# Altium integrated library Integrated_Library1.IntLib: 59 symbols
Pins are listed as number, name and electrical type; pins without a type are passive.

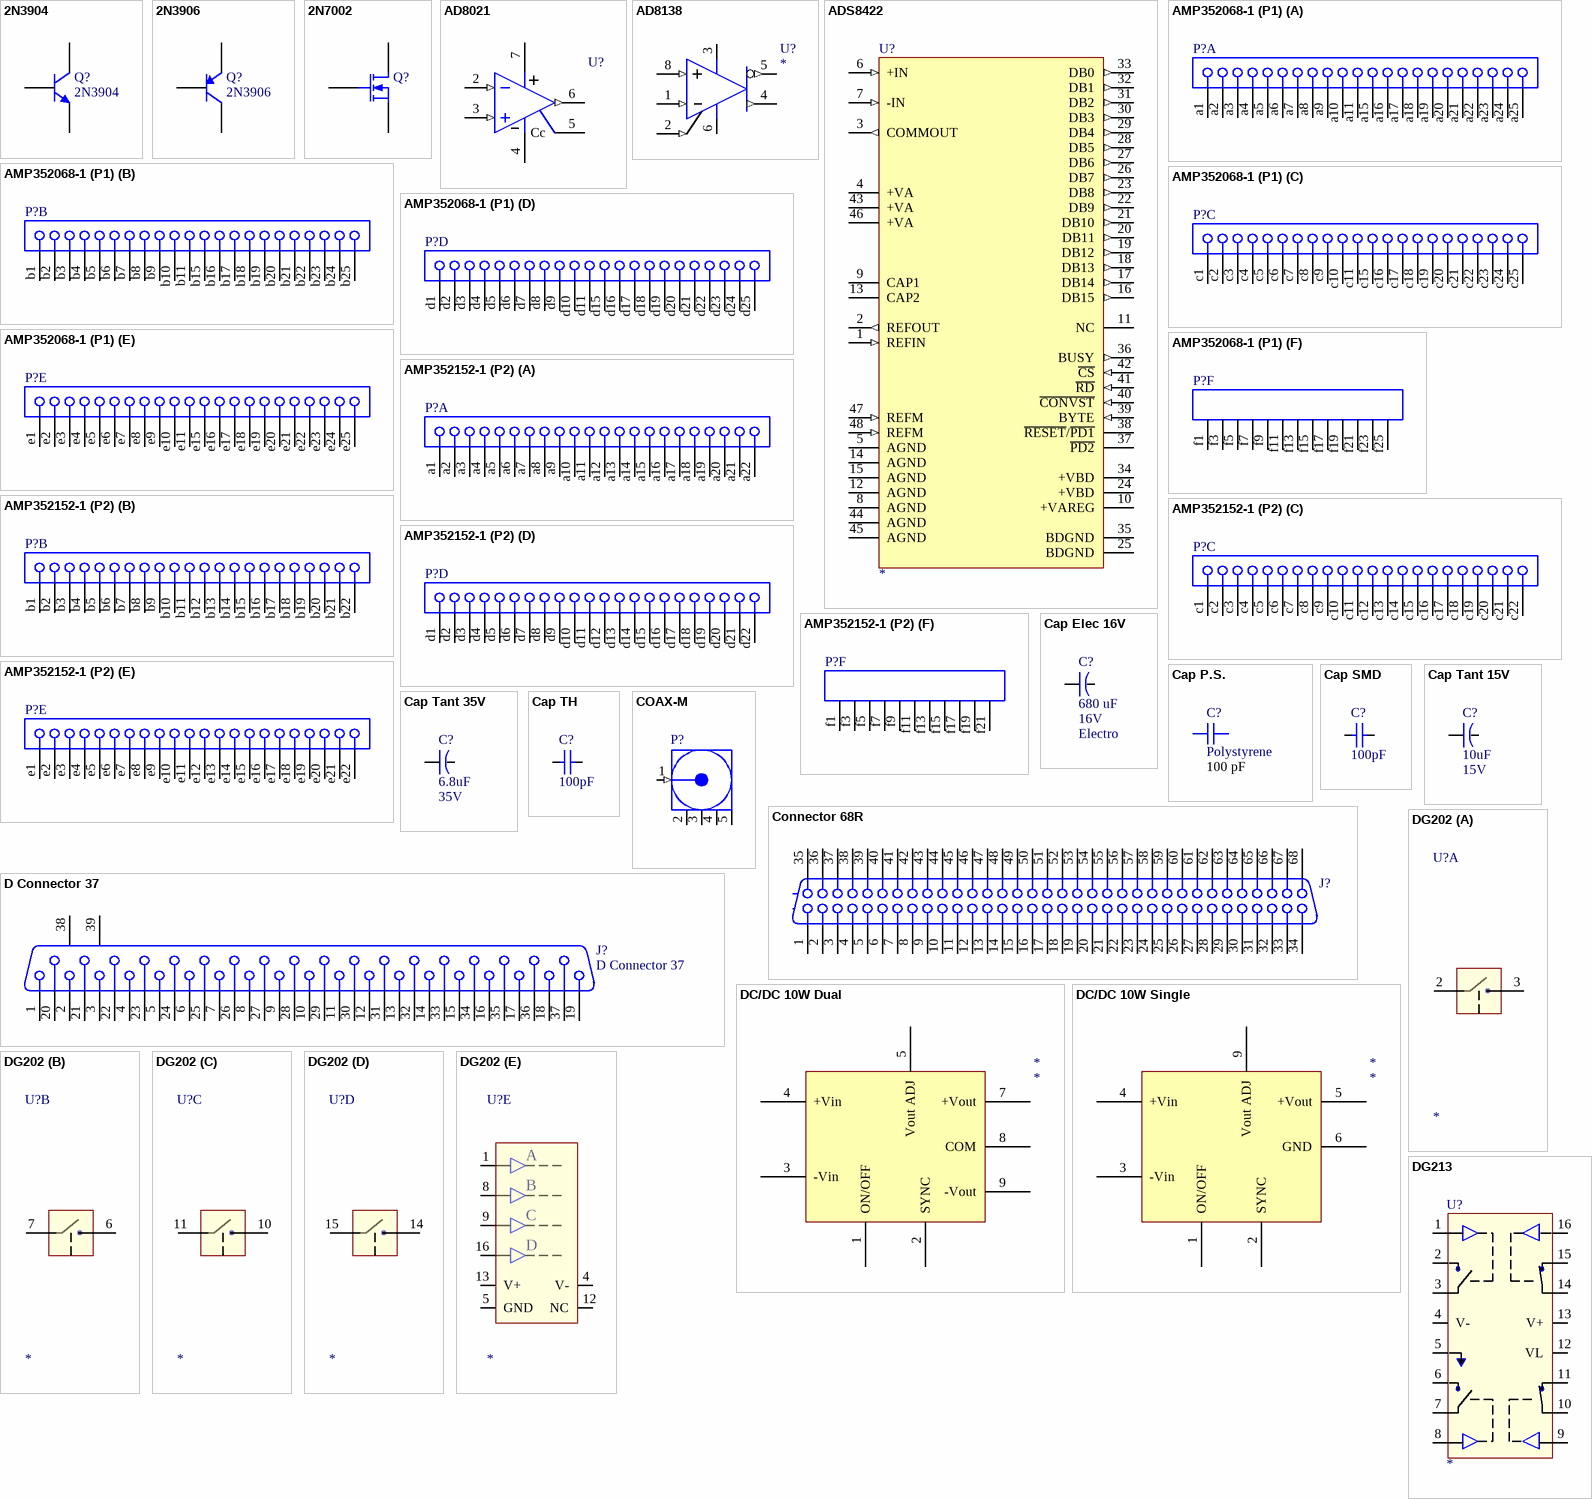
[diagram p0: symbols 2N3904 to DG213]

## 2N3904
designator Q?
NPN SOT23; Published: 8-Jun-2000; LatestRevisionDate: 15-Jan-2003; LatestRevisionNote: PCB Footprint 'BCY-W3/D4.7' replaced; DatasheetDocument: 1997; PackageDocument: Sep-1998; PackageReference: TO-92A; Publisher: Altium Limited; Code_JEDEC: TO-92A; ComponentLink1Description: Manufacturer Link; ComponentLink1URL: http://www.fairchildsemi.com/; ComponentLink2Description: Datasheet; ComponentLink2URL: http://www.fairchildsemi.com/ds/2N%2F2N3904.pdf
footprint SOT23 (SOT-23; 3 Leads; Body 3.1 x 2.5 mm, inc. leads (LxW max), Alternate Lead Configuration)
pins: 1 C, 2 E, 3 B

## 2N3906
designator Q?
PNP SOT23; Published: 8-Jun-2000; LatestRevisionDate: 15-Jan-2003; LatestRevisionNote: PCB Footprint 'BCY-W3/D4.7' replaced; DatasheetDocument: 1997; PackageDocument: Sep-1998; PackageReference: TO-92A; Publisher: Altium Limited; Code_JEDEC: TO-92A; ComponentLink1Description: Manufacturer Link; ComponentLink1URL: http://www.fairchildsemi.com/; ComponentLink2Description: Datasheet; ComponentLink2URL: http://www.fairchildsemi.com/ds/2N%2F2N3904.pdf
footprint SOT23 (SOT-23; 3 Leads; Body 3.1 x 2.5 mm, inc. leads (LxW max), Alternate Lead Configuration)
pins: 1 C, 2 E, 3 B

## 2N7002
designator Q?
N-Chan MOSFET; PackageDocument: 1995/1996; Published: 8-Jun-2000; LatestRevisionDate: 17-Jul-2002; LatestRevisionNote: Re-released for DXP Platform.; PackageReference: E3; Publisher: Altium Limited
footprint SOT23 (SOT-23; 3 Leads; Body 3.1 x 2.5 mm, inc. leads (LxW max), Alternate Lead Configuration)
pins: 1 D, 2 S, 3 G

## AD8021
designator U?
Low Noise, High Speed Amplifier; Note: Pin 8 is not connected.; Published: 8-Jun-2000; LatestRevisionDate: 04-Mar-2005; LatestRevisionNote: Stylized 3D Model Added.; DatasheetVersion: 1992; PackageVersion: 1998; PackageReference: Q-8; Publisher: Altium Limited; PackageDescription: MSOP-8; ComponentLink1Description: Manufacturer Link; ComponentLink1URL: http://www.analog.com/en/prod/0,,759_786_AD745%2C00.html; ComponentLink2Description: Datasheet; ComponentLink2URL: http://www.analog.com/UploadedFiles/Data_Sheets/14077819AD745_d.pdf
footprint RM-8 (Shrink Small Outline, MSOP; 8 Leads; Body Width 3 mm; Pitch 0.65 mm)
pins: 1 LOGIC REF hidden, 2 IN- (in), 3 IN+ (in), 4 V- (power), 5 Cc, 6 OUT (out), 7 V+ (power), 8 /DISABLE hidden

## AD8138
designator U?
AD8138
footprint 182h_m (8-Pin Small Outline Integrated Circuit 1.27 mm Pitch, IPC Low Density)
pins: 1 -IN (in), 2 VOCM (in), 3 V+, 4 +OUT (out), 5 -OUT (out), 6 V-, 7 NC hidden, 8 +IN (in)

## ADS8422
designator U?
AD8422
footprint TQFP48_m (48-Pin Thin Quad Flat Pack 0.5 mm Pitch, IPC Low Density)
pins: 1 REFIN (in), 2 REFOUT (out), 3 COMMOUT (out), 4 +VA, 5 AGND, 6 +IN (in), 7 -IN (in), 8 AGND, 9 CAP1, 10 +VAREG, 11 NC, 12 AGND, 13 CAP2, 14 AGND, 15 AGND, 16 DB15 (out), 17 DB14 (out), 18 DB13 (out), 19 DB12 (out), 20 DB11 (out), 21 DB10 (out), 22 DB9 (out), 23 DB8 (out), 24 +VBD, 25 BDGND, 26 DB7 (out), 27 DB6 (out), 28 DB5 (out), 29 DB4 (out), 30 DB3 (out), 31 DB2 (out), 32 DB1 (out), 33 DB0 (out), 34 +VBD, 35 BDGND, 36 BUSY (out), 37 ~{PD2}, 38 ~{RESET}/~{PD1}, 39 BYTE (in), 40 ~{CONVST} (in), 41 ~{RD} (in), 42 ~{CS} (in), 43 +VA, 44 AGND, 45 AGND, 46 +VA, 47 REFM (in), 48 REFM (in)

## AMP352068-1 (P1)
designator P?
PXI P1 TYPE A, 110PIN; Positions: 110; ComponentLength: 50 mm; MatingPolarization: Multi-Purpose Center; RowsLoaded: A, B, D, C, E; PCB_Layout: Complies with manufacturer's recommendation.; DrillSize: Corresponds to nominal value.; Published: 17-Jul-2002; DatasheetDocument: 19-Jul-2000; PackageDocument: 19-Jul-2000; PackageReference: 352068-1; Publisher: Altium Limited; Orientation: Right Angle; ComponentLink1Description: Manufacturer Link; ComponentLink1URL: http://www.tycoelectronics.com/; ComponentLink2Description: Packaging Specification; ComponentLink2URL: http://ecommas.tycoelectronics.com/commerce/DocumentDelivery/DDEController?Action=showdoc&DocId=Customer+Drawing%7F352068%7FG%7Fpdf%7FEnglish%7FENG_CD_352068_G.pdf; ComponentLink3Description: Iges Model; ComponentLink3URL: http://catalog.tycoelectronics.com/TE/docs/cadgeo/2/36/34632.tar.gz
footprint PXI P1 Type A 110PIN (Connector; CompactPCI; 110 Position; Right Angle)
part A pins: a1, a2, a3, a4, a5, a6, a7, a8, a9, a10, a11, a15, a16, a17, a18, a19, a20, a21, a22, a23, a24, a25
part B pins: b1, b2, b3, b4, b5, b6, b7, b8, b9, b10, b11, b15, b16, b17, b18, b19, b20, b21, b22, b23, b24, b25
part C pins: c1, c2, c3, c4, c5, c6, c7, c8, c9, c10, c11, c15, c16, c17, c18, c19, c20, c21, c22, c23, c24, c25
part D pins: d1, d2, d3, d4, d5, d6, d7, d8, d9, d10, d11, d15, d16, d17, d18, d19, d20, d21, d22, d23, d24, d25
part E pins: e1, e2, e3, e4, e5, e6, e7, e8, e9, e10, e11, e15, e16, e17, e18, e19, e20, e21, e22, e23, e24, e25
part F pins: f1, f3, f5, f7, f9, f11, f13, f15, f17, f19, f21, f23, f25

## AMP352152-1 (P2)
designator P?
PXI P2 TYPE B, 110PIN; Positions: 110; ComponentLength: 44 mm; MatingPolarization: None; RowsLoaded: A, B, D, C, E; PCB_Layout: Complies with manufacturer's recommendation.; DrillSize: Corresponds to nominal value.; Published: 17-Jul-2002; DatasheetDocument: 20-Jul-2000; PackageDocument: 20-Jul-2000; PackageReference: 352152-1; Publisher: Altium Limited; Orientation: Right Angle; ComponentLink1Description: Manufacturer Link; ComponentLink1URL: http://www.tycoelectronics.com/; ComponentLink2Description: Packaging Specification; ComponentLink2URL: http://ecommas.tycoelectronics.com/commerce/DocumentDelivery/DDEController?Action=showdoc&DocId=Customer+Drawing%7F352152%7FG%7Fpdf%7FEnglish%7FENG_CD_352152_G.pdf; ComponentLink3Description: Iges Model; ComponentLink3URL: http://catalog.tycoelectronics.com/TE/docs/cadgeo/6/66/38666.tar.gz
footprint PXI P2 TYPE B 110PIN (Connector; CompactPCI; 110 Position; Right Angle)
footprint 352152-1 PXI pinout (Connector; CompactPCI; 110 Position; Right Angle)
part A pins: a1, a2, a3, a4, a5, a6, a7, a8, a9, a10, a11, a12, a13, a14, a15, a16, a17, a18, a19, a20, a21, a22
part B pins: b1, b2, b3, b4, b5, b6, b7, b8, b9, b10, b11, b12, b13, b14, b15, b16, b17, b18, b19, b20, b21, b22
part C pins: c1, c2, c3, c4, c5, c6, c7, c8, c9, c10, c11, c12, c13, c14, c15, c16, c17, c18, c19, c20, c21, c22
part D pins: d1, d2, d3, d4, d5, d6, d7, d8, d9, d10, d11, d12, d13, d14, d15, d16, d17, d18, d19, d20, d21, d22
part E pins: e1, e2, e3, e4, e5, e6, e7, e8, e9, e10, e11, e12, e13, e14, e15, e16, e17, e18, e19, e20, e21, e22
part F pins: f1, f3, f5, f7, f9, f11, f13, f15, f17, f19, f21

## Cap Elec 16V
designator C?, comment value 680 uF  Voltage: 16V  Capacitor type: Electro  (hidden comment: 16V Elec)
Panasonic TG series low ESR; Published: 23-Sep-2002; PackageReference: CAPR5-4X5; Publisher: Altium Limited
footprint SMD_Pana size H13 (Size H13)
footprint SMD_Pana TG (Size J16)
pins: 1, 2

## Cap P.S.
designator C?, comment Polystyrene  value 100 pF
Square Polystyrene Cap
footprint Cap P.S.
pins: 1, 2

## Cap SMD
designator C?  value 100pF
Capacitor; Published: 8-Jun-2000; LatestRevisionDate: 17-Jul-2002; LatestRevisionNote: Re-released for DXP Platform.; PackageReference: RAD-0.3; Publisher: Altium Limited
footprint SMD_0805
pins: 1, 2

## Cap Tant 15V
designator C?, comment value 10uF  (hidden comment: 15V)
outline 3.2mm x 1.6mm; Published: 23-Sep-2002; PackageReference: CAPR5-4X5; Publisher: Altium Limited; Voltage: 15V
footprint SMD_CAP_3216
pins: 1, 2

## Cap Tant 35V
designator C?, comment value 6.8uF  (hidden comment: 35V)
outline 6.0mm x 3.2mm; Published: 23-Sep-2002; PackageReference: CAPR5-4X5; Publisher: Altium Limited; Voltage: 35V
footprint SMD_CAP_6032
footprint SMD_CAP_7343
pins: neg 2, pos 1

## Cap TH
designator C?  value 100pF
Capacitor; Published: 8-Jun-2000; LatestRevisionDate: 17-Jul-2002; LatestRevisionNote: Re-released for DXP Platform.; PackageReference: RAD-0.3; Publisher: Altium Limited
footprint RAD-0.1 (Indicating Instrument; 2 Leads)
footprint RAD-0.2 (Jumper Wire; 2 Leads)
pins: 1, 2

## COAX-M
designator P?
RF Coaxial PCB Connector, MMCX; Thru-Hole, Vertical Mount Plug,  50 Ohm Impedance; PackageDocument: Rev. A, 16-Jun-1997; PCB_Layout: Complies with manufacturer's recommendation.; DrillSize: Corresponds to nominal value.; Published: 15-Jul-2004; LatestRevisionDate: 15-Jul-2004; LatestRevisionNote: Component Replaced.; DatasheetDocument: 30-May-2003; PackageReference: 908-21103; Publisher: Altium Limited; ComponentLink1Description: Manufacturer Link; ComponentLink1URL: http://www.amphenolrf.com/
footprint MMCX2.54-V5 (Connector; RF Coaxial, MMCX, Thru-Hole; 5 Position; Vertical)
pins: 1 Signal (in) "Signal Pin", 2 GND (power), 3 GND (power), 4 GND (power), 5 GND (power)

## Connector 68R
designator J?
Receptacle Header Assemby; PackageDocument: B; Positions: 68; Published: 15-Jun-2001; LatestRevisionDate: 17-Jul-2002; LatestRevisionNote: Re-released for DXP Platform.; DatasheetDocument: 1-Oct-1983; PackageReference: 178240-8; Publisher: Altium Limited; Orientation: Right Angle
footprint CHAMP1.27-2H68 (Connector; 68 Position; Right Angle; Pitch 1.27 mm)
signal-integrity model Connector
pins: 1, 2, 3, 4, 5, 6, 7, 8, 9, 10, 11, 12, 13, 14, 15, 16, 17, 18, 19, 20, 21, 22, 23, 24, 25, 26, 27, 28, 29, 30, 31, 32, 33, 34, 35, 36, 37, 38, 39, 40, 41, 42, 43, 44, 45, 46, 47, 48, 49, 50, 51, 52, 53, 54, 55, 56, 57, 58, 59, 60, 61, 62, 63, 64, 65, 66, 67, 68

## D Connector 37
designator J?
Receptacle Assembly, 37 Position, Right Angle; PackageDocument: U; Positions: 25; Published: 15-Jun-2001; LatestRevisionDate: 17-Jul-2002; LatestRevisionNote: Re-released for DXP Platform.; DatasheetDocument: 19-Mar-1999; PackageReference: 787202; Publisher: Altium Limited; Orientation: Right Angle; Gender: Receptacle
footprint DSUB37 RT FEM (Connector; D Subminiature; 37 Position; Right Angle; Pitch 1.385 mm)
signal-integrity model Connector
pins: 1, 2, 3, 4, 5, 6, 7, 8, 9, 10, 11, 12, 13, 14, 15, 16, 17, 18, 19, 20, 21, 22, 23, 24, 25, 26, 27, 28, 29, 30, 31, 32, 33, 34, 35, 36, 37, 38 MH2, 39 MH1

## DC/DC 10W Dual
designator *
footprint BetaDyne DC/DC 10W
pins: 1 ON/OFF, 2 SYNC, 3 -Vin, 4 +Vin, 5 Vout ADJ, 7 +Vout, 8 COM, 9 -Vout

## DC/DC 10W Single
designator *
footprint BetaDyne DC/DC 10W
pins: 1 ON/OFF, 2 SYNC, 3 -Vin, 4 +Vin, 5 +Vout, 6 GND, 9 Vout ADJ

## DG202
designator U?
DG202 SPST N.O.
footprint SOIC16 (Small Outline; 16 Leads; Body Width 3.9 mm; Pitch 1.27 mm)
part A pins: 2 D1, 3 S1
part B pins: 6 D2, 7 S2
part C pins: 10 S3, 11 D3
part D pins: 14 S4, 15 D4
part E pins: 1 IN1, 4 V-, 5 GND, 8 IN1, 9 IN1, 12 NC, 13 V+, 16 IN1
part E text: A; B; C; D

## DG213
designator U?
DG213 Rail to Rail inputs
footprint SOIC16 (Small Outline; 16 Leads; Body Width 3.9 mm; Pitch 1.27 mm)
pins: 1 IN1, 2 D1, 3 S1, 4 V-, 5 GND, 6 D2, 7 S2, 8 IN2, 9 IN3, 10 D3, 11 S4, 12 VL, 13 V+, 14 S4, 15 D4, 16 IN4

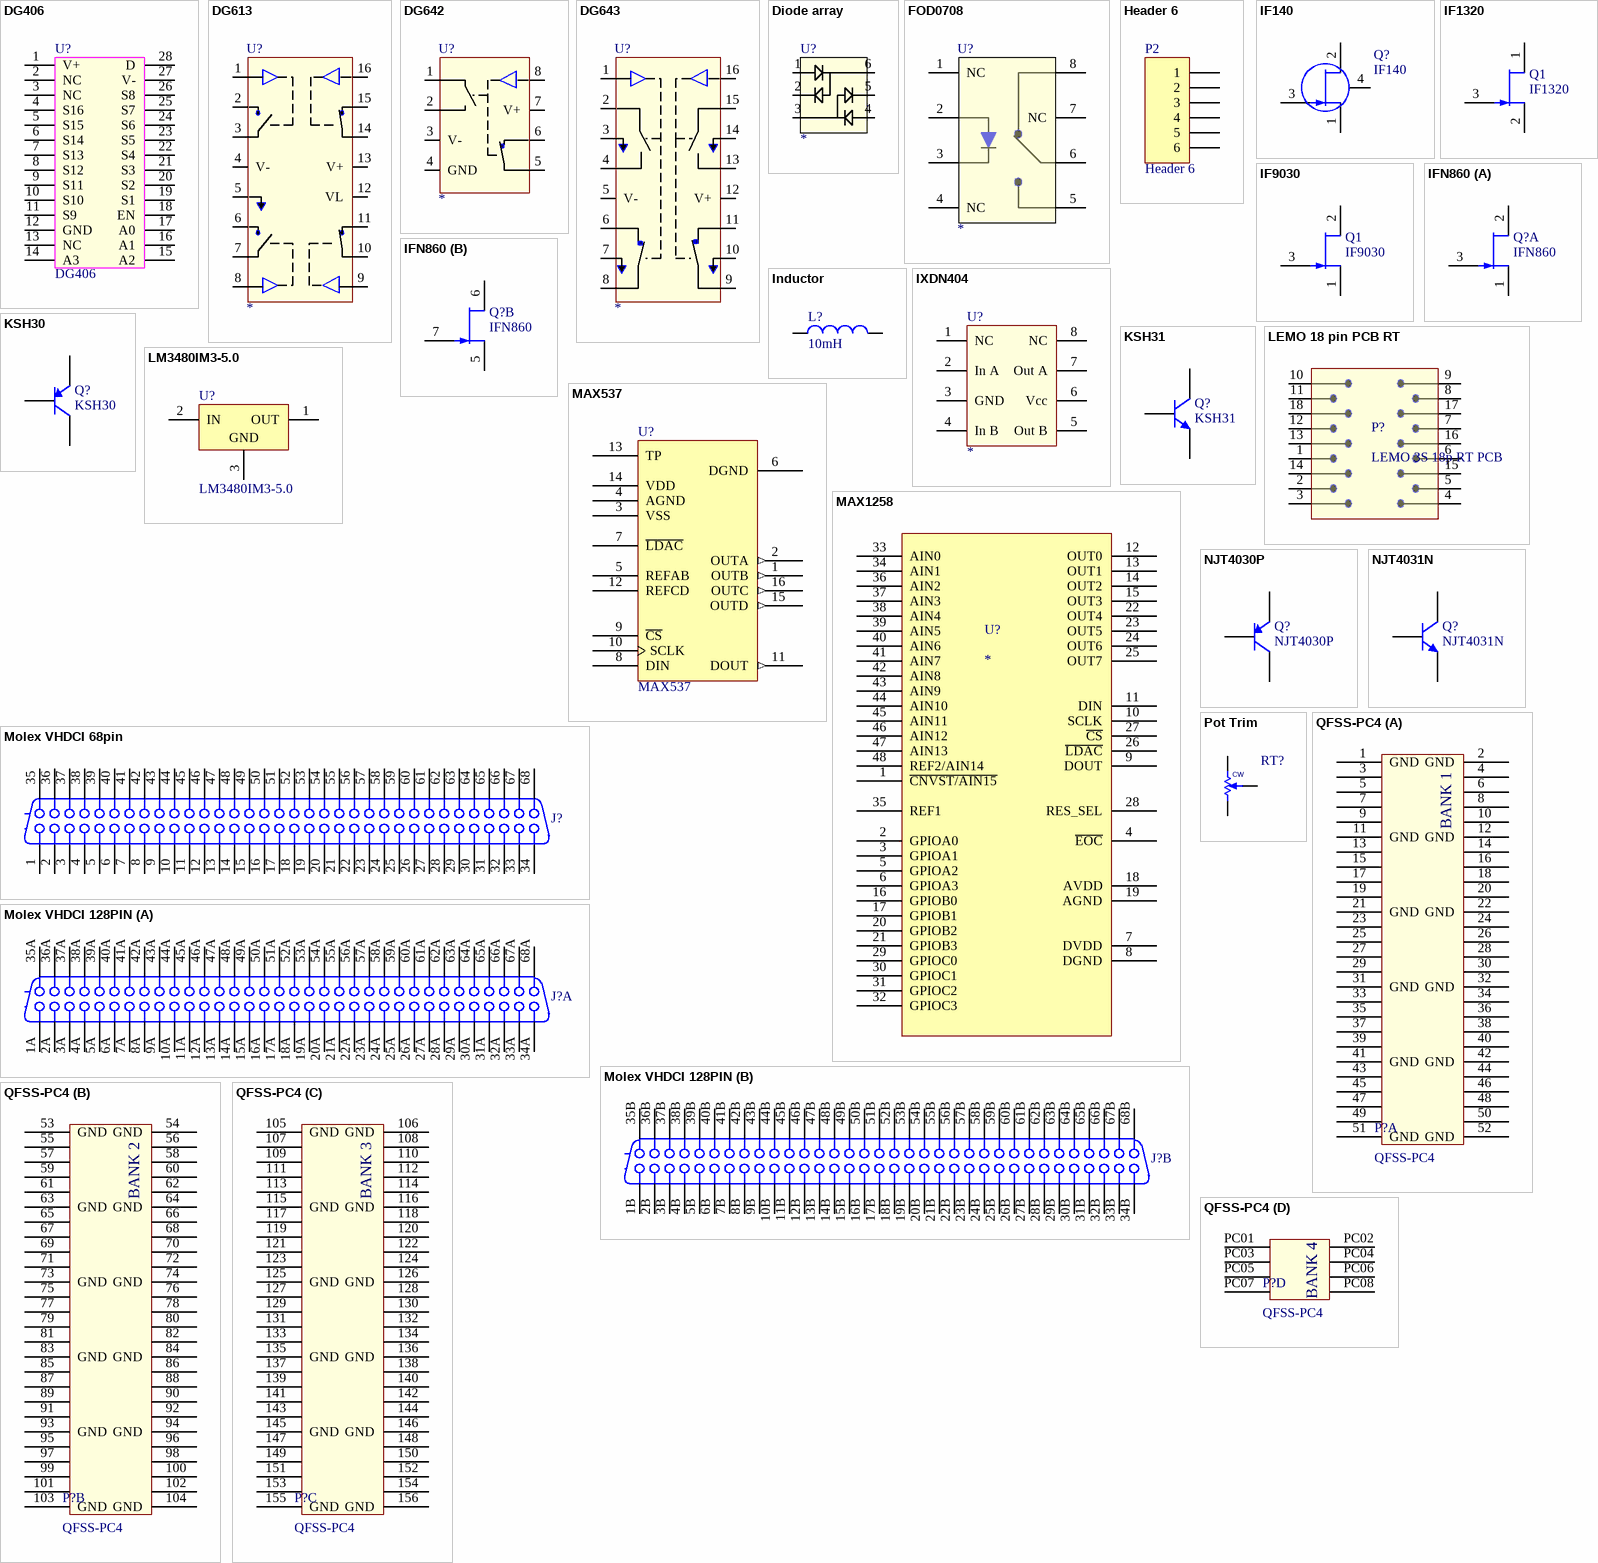
[diagram p1: symbols DG406 to QFSS-PC4]

## DG406
designator U?
16 TO 1 MUX
footprint SMD_SOW28_W/D
pins: 1 V+, 2 NC, 3 NC, 4 S16, 5 S15, 6 S14, 7 S13, 8 S12, 9 S11, 10 S10, 11 S9, 12 GND, 13 NC, 14 A3, 15 A2, 16 A1, 17 A0, 18 EN, 19 S1, 20 S2, 21 S3, 22 S4, 23 S5, 24 S6, 25 S7, 26 S8, 27 V-, 28 D

## DG613
designator U?
DG613  Low glitch
footprint SOIC16 (Small Outline; 16 Leads; Body Width 3.9 mm; Pitch 1.27 mm)
pins: 1 IN1, 2 D1, 3 S1, 4 V-, 5 GND, 6 D2, 7 S2, 8 IN2, 9 IN3, 10 D3, 11 S4, 12 VL, 13 V+, 14 S4, 15 D4, 16 IN4

## DG642
designator U?
DG642
footprint 182H_m (8-Pin Small Outline Integrated Circuit 1.27 mm Pitch, IPC Low Density)
pins: 1 S1, 2 D1, 3 V-, 4 GND, 5 S2, 6 D2, 7 V+ "VGFHSDF", 8 IN

## DG643
designator U?
DG643
footprint SOIC16 (Small Outline; 16 Leads; Body Width 3.9 mm; Pitch 1.27 mm)
pins: 1 IN1, 2 D1, 3 GND, 4 S1, 5 V-, 6 S4, 7 GND, 8 D4, 9 D3, 10 GND, 11 S3, 12 V+, 13 S2, 14 GND, 15 D2, 16 IN2

## Diode array
designator U?
Dual series array
footprint SOT-363 (SOT-363/SC-88; 6 Leads; Body 2.2 x 2.2 mm, inc. leads (LxW max))
pins: 1 A1, 2 C1, 3 AC2, 4 A2, 5 C2, 6 AC1

## FOD0708
designator U?
CMOS Optocoupler
footprint 182H_M (8-Pin Small Outline Integrated Circuit 1.27 mm Pitch, IPC Low Density)
pins: 1 NC, 2 Anode, 3 Cathode, 4 NC, 5 GND, 6 Out, 7 NC, 8 VCC

## Header 6
designator P2
Header, 6-Pin; LatestRevisionDate: 17-Jul-2002; LatestRevisionNote: Re-released for DXP Platform.; Publisher: Altium Limited
footprint HDR1X6 (Connector; Header; 6 Position)
signal-integrity model Connector
pins: 1, 2, 3, 4, 5, 6

## IF140
designator Q?
N-JFET NJ14AL Process; Published: 8-Jun-2000; LatestRevisionDate: 17-Jul-2002; LatestRevisionNote: Re-released for DXP Platform.; PackageReference: TO-254-AA; Publisher: Altium Limited; Code_JEDEC: TO-254-AA
footprint TO-72 (Can; 4 Leads; Pin Circle Dia. 2.54 mm; Lead Dia. 0.48 mm (max))
pins: 1 S, 2 D, 3 G, 4 Case

## IF1320
designator Q1
N-JFET NJ132L Process; Published: 8-Jun-2000; LatestRevisionDate: 17-Jul-2002; LatestRevisionNote: Re-released for DXP Platform.; PackageReference: TO-254-AA; Publisher: Altium Limited; Code_JEDEC: TO-254-AA
simulation model NJFET
footprint SOT23A (SOT-23; 3 Leads; Body 3.0 x 2.5 mm, inc. leads (LxW max))
pins: 1 D, 2 S, 3 G

## IF9030
designator Q1
N-JFET NJ9030L Process; Published: 8-Jun-2000; LatestRevisionDate: 17-Jul-2002; LatestRevisionNote: Re-released for DXP Platform.; PackageReference: TO-254-AA; Publisher: Altium Limited; Code_JEDEC: TO-254-AA
simulation model NJFET
footprint TO-52 (Can; 3 Leads; Pin Circle Dia. 2.54 mm)
pins: 1 S, 2 D, 3 G

## IFN860
designator Q?
N-JFET NJ450L Process; Published: 8-Jun-2000; LatestRevisionDate: 17-Jul-2002; LatestRevisionNote: Re-released for DXP Platform.; PackageReference: TO-254-AA; Publisher: Altium Limited; Code_JEDEC: TO-254-AA
footprint TO-71 (Can; 7 Leads (1 Absent); Pin Circle Dia. 2.54 mm; Lead Dia. 0.48 mm (max))
part A pins: 1 S, 2 D, 3 G
part B pins: 5 S, 6 D, 7 G

## Inductor
designator L?  value 10mH
Inductor; Code_IEC: 1005; Published: 8-Jun-2000; LatestRevisionDate: 17-Jul-2002; LatestRevisionNote: Re-released for DXP Platform.; PackageReference: 0402-A; Publisher: Altium Limited; Code_JEITA: 0402
simulation model INDUCTOR (Inductor)
signal-integrity model Inductor
footprint SMD_1210_INDUCT
pins: 1, 2

## IXDN404
designator U?
MOSFET driver non-inverting
footprint DIP-8 (DIP; 8 Leads; Row Spacing 7.62 mm; Pitch 2.54 mm)
footprint 182H_M (8-Pin Small Outline Integrated Circuit 1.27 mm Pitch, IPC Low Density)
pins: 1 NC, 2 In A, 3 GND, 4 In B, 5 Out B, 6 Vcc, 7 Out A, 8 NC

## KSH30
designator Q?
PNP TO-252 (D-PAK); Published: 8-Jun-2000; LatestRevisionDate: 15-Jan-2003; LatestRevisionNote: PCB Footprint 'BCY-W3/D4.7' replaced; DatasheetDocument: 1997; PackageDocument: Sep-1998; PackageReference: TO-92A; Publisher: Altium Limited; Code_JEDEC: TO-92A; ComponentLink1Description: Manufacturer Link; ComponentLink1URL: http://www.fairchildsemi.com/; ComponentLink2Description: Datasheet; ComponentLink2URL: http://www.fairchildsemi.com/ds/2N%2F2N3904.pdf
footprint TO-252(D-PAK)  PowerPAD (D-PAK, 3-Pads, Body 6.2x6.7mm (max), IPC Medium Density)
pins: 1 B, 3 E, 4 C

## KSH31
designator Q?
NPN TO-252 (D-PAK); Published: 8-Jun-2000; LatestRevisionDate: 15-Jan-2003; LatestRevisionNote: PCB Footprint 'BCY-W3/D4.7' replaced; DatasheetDocument: 1997; PackageDocument: Sep-1998; PackageReference: TO-92A; Publisher: Altium Limited; Code_JEDEC: TO-92A; ComponentLink1Description: Manufacturer Link; ComponentLink1URL: http://www.fairchildsemi.com/; ComponentLink2Description: Datasheet; ComponentLink2URL: http://www.fairchildsemi.com/ds/2N%2F2N3904.pdf
footprint TO-252(D-PAK)  PowerPAD (D-PAK, 3-Pads, Body 6.2x6.7mm (max), IPC Medium Density)
pins: 1 B, 3 E, 4 C

## LEMO 18 pin PCB RT
designator P?, comment LEMO 3S 18p RT PCB
LEMO S3 18p RT
pins: 1, 2, 3, 4, 5, 6, 7, 8, 9, 10, 11, 12, 13, 14, 15, 16, 17, 18

## LM3480IM3-5.0
designator U?
3-Terminal Positive Regulator; Published: 15-Apr-2002; DatasheetVersion: Sep-1999; PackageVersion: 2000; PackageReference: Z03A; Publisher: Altium Limited; PackageDescription: TO, Flat Index; 3 In-Line, Axial Leads; Body Dia. 4.6mm; Leads 0.53 x 0.39 mm (max); ComponentLink1Description: Manufacturer Link; ComponentLink1URL: http://www.national.com/; ComponentLink2Description: Datasheet; ComponentLink2URL: http://www.national.com/ds.cgi/LM/LM78L05.pdf; ComponentLink3Description: URL Link1; ComponentLink3URL: http://www.national.com/pf/LM/LM78L05.html
footprint SOT23A (SOT-23; 3 Leads; Body 3.0 x 2.5 mm, inc. leads (LxW max))
pins: 1 OUT, 2 IN, 3 GND

## MAX537
designator U?
MAX537 Quad 12bit DAC
footprint WSO16_M (SOIC, 16-Leads, Body 10.3x7.5mm, Pitch 1.27mm, IPC Low Density)
pins: 1 OUTB (out), 2 OUTA (out), 3 VSS, 4 AGND, 5 REFAB, 6 DGND, 7 ~{LDAC}, 8 DIN, 9 ~{CS}, 10 SCLK, 11 DOUT (out), 12 REFCD, 13 TP, 14 VDD, 15 OUTD (out), 16 OUTC (out)

## MAX1258
designator U?
12-Bit MultChan ADC/DAC
footprint QFN48_M (QFN, 48-Leads, Body 7x7mm, Pitch 0.5mm, IPC Low Density)
pins: 1 ~{CNVST/AIN15}, 2 GPIOA0, 3 GPIOA1, 4 ~{EOC}, 5 GPIOA2, 6 GPIOA3, 7 DVDD, 8 DGND, 9 DOUT, 10 SCLK, 11 DIN, 12 OUT0, 13 OUT1, 14 OUT2, 15 OUT3, 16 GPIOB0, 17 GPIOB1, 18 AVDD, 19 AGND, 20 GPIOB2, 21 GPIOB3, 22 OUT4, 23 OUT5, 24 OUT6, 25 OUT7, 26 ~{LDAC}, 27 ~{CS}, 28 RES_SEL, 29 GPIOC0, 30 GPIOC1, 31 GPIOC2, 32 GPIOC3, 33 AIN0, 34 AIN1, 35 REF1, 36 AIN2, 37 AIN3, 38 AIN4, 39 AIN5, 40 AIN6, 41 AIN7, 42 AIN8, 43 AIN9, 44 AIN10, 45 AIN11, 46 AIN12, 47 AIN13, 48 REF2/AIN14

## Molex VHDCI 68pin
designator J?
Receptacle Header Assemby; PackageDocument: B; Positions: 68; Published: 15-Jun-2001; LatestRevisionDate: 17-Jul-2002; LatestRevisionNote: Re-released for DXP Platform.; DatasheetDocument: 1-Oct-1983; PackageReference: 178240-8; Publisher: Altium Limited; Orientation: Right Angle
footprint Molex VHDCI 68pin
footprint HONDA VHDCI straddle mount (68 pin VHDCI PCB straddle mount)
footprint 3M Pak 50 68pin (68 pin RT angle thru hole)
pins: 1, 2, 3, 4, 5, 6, 7, 8, 9, 10, 11, 12, 13, 14, 15, 16, 17, 18, 19, 20, 21, 22, 23, 24, 25, 26, 27, 28, 29, 30, 31, 32, 33, 34, 35, 36, 37, 38, 39, 40, 41, 42, 43, 44, 45, 46, 47, 48, 49, 50, 51, 52, 53, 54, 55, 56, 57, 58, 59, 60, 61, 62, 63, 64, 65, 66, 67, 68

## Molex VHDCI 128PIN
designator J?
Receptacle Header Assemby; PackageDocument: B; Positions: 68; Published: 15-Jun-2001; LatestRevisionDate: 17-Jul-2002; LatestRevisionNote: Re-released for DXP Platform.; DatasheetDocument: 1-Oct-1983; PackageReference: 178240-8; Publisher: Altium Limited; Orientation: Right Angle
footprint Molex VHDCI 136pin
part A pins: 1A 1, 2A 2, 3A 3, 4A 4, 5A 5, 6A 6, 7A 7, 8A 8, 9A 9, 10A 10, 11A 11, 12A 12, 13A 13, 14A 14, 15A 15, 16A 16, 17A 17, 18A 18, 19A 19, 20A 20, 21A 21, 22A 22, 23A 23, 24A 24, 25A 25, 26A 26, 27A 27, 28A 28, 29A 29, 30A 30, 31A 31, 32A 32, 33A 33, 34A 34, 35A 35, 36A 36, 37A 37, 38A 38, 39A 39, 40A 40, 41A 41, 42A 42, 43A 43, 44A 44, 45A 45, 46A 46, 47A 47, 48A 48, 49A 49, 50A 50, 51A 51, 52A 52, 53A 53, 54A 54, 55A 55, 56A 56, 57A 57, 58A 58, 59A 59, 60A 60, 61A 61, 62A 62, 63A 63, 64A 64, 65A 65, 66A 66, 67A 67, 68A 68
part B pins: 1B 1, 2B 2, 3B 3, 4B 4, 5B 5, 6B 6, 7B 7, 8B 8, 9B 9, 10B 10, 11B 11, 12B 12, 13B 13, 14B 14, 15B 15, 16B 16, 17B 17, 18B 18, 19B 19, 20B 20, 21B 21, 22B 22, 23B 23, 24B 24, 25B 25, 26B 26, 27B 27, 28B 28, 29B 29, 30B 30, 31B 31, 32B 32, 33B 33, 34B 34, 35B 35, 36B 36, 37B 37, 38B 38, 39B 39, 40B 40, 41B 41, 42B 42, 43B 43, 44B 44, 45B 45, 46B 46, 47B 47, 48B 48, 49B 49, 50B 50, 51B 51, 52B 52, 53B 53, 54B 54, 55B 55, 56B 56, 57B 57, 58B 58, 59B 59, 60B 60, 61B 61, 62B 62, 63B 63, 64B 64, 65B 65, 66B 66, 67B 67, 68B 68

## NJT4030P
designator Q?
PNP 40V 3A 2W; Published: 8-Jun-2000; LatestRevisionDate: 15-Jan-2003; LatestRevisionNote: PCB Footprint 'BCY-W3/D4.7' replaced; DatasheetDocument: 1997; PackageDocument: Sep-1998; PackageReference: TO-92A; Publisher: Altium Limited; Code_JEDEC: TO-92A; ComponentLink1Description: Manufacturer Link; ComponentLink1URL: http://www.fairchildsemi.com/; ComponentLink2Description: Datasheet; ComponentLink2URL: http://www.fairchildsemi.com/ds/2N%2F2N3904.pdf
footprint SOT223 w/PowerPAD (SOT-223/SC-73; 4 Leads; Body 6.7 x 7.3 mm, inc. leads (LxW max))
pins: 1 B, 3 E, 4 C

## NJT4031N
designator Q?
NPN 40V 3A 2W; Published: 8-Jun-2000; LatestRevisionDate: 15-Jan-2003; LatestRevisionNote: PCB Footprint 'BCY-W3/D4.7' replaced; DatasheetDocument: 1997; PackageDocument: Sep-1998; PackageReference: TO-92A; Publisher: Altium Limited; Code_JEDEC: TO-92A; ComponentLink1Description: Manufacturer Link; ComponentLink1URL: http://www.fairchildsemi.com/; ComponentLink2Description: Datasheet; ComponentLink2URL: http://www.fairchildsemi.com/ds/2N%2F2N3904.pdf
footprint SOT223 w/PowerPAD (SOT-223/SC-73; 4 Leads; Body 6.7 x 7.3 mm, inc. leads (LxW max))
pins: 1 B, 3 E, 4 C

## Pot Trim
designator RT?
SMD Pot Bourns 3214W; Published: 17-Dec-2003; DatasheetDocument: Oct-2003; PackageReference: POT4MM-2; Publisher: Altium Limited; ComponentLink1Description: Manufacturer Link; ComponentLink1URL: http://bourns.com/2/search.html
footprint POT Bournes 3214W (SMD Trim Pot)
pins: CCW -, CW +, W
1 alternate drawing of the same symbol

## QFSS-PC4
designator P?
SAMTEC QFSS W/PWR PINS
footprint QFS SMD PWR PINS (78 pos (156 pin) + 8 pwr pins)
3D model QFS-078-01-X-D-PC4 (PCB3D Model)
part A pins: 1 GND, 2 GND, 3, 4, 5, 6, 7, 8, 9, 10, 11 GND, 12 GND, 13, 14, 15, 16, 17, 18, 19, 20, 21 GND, 22 GND, 23, 24, 25, 26, 27, 28, 29, 30, 31 GND, 32 GND, 33, 34, 35, 36, 37, 38, 39, 40, 41 GND, 42 GND, 43, 44, 45, 46, 47, 48, 49, 50, 51 GND, 52 GND
part B pins: 53 GND, 54 GND, 55, 56, 57, 58, 59, 60, 61, 62, 63 GND, 64 GND, 65, 66, 67, 68, 69, 70, 71, 72, 73 GND, 74 GND, 75, 76, 77, 78, 79, 80, 81, 82, 83 GND, 84 GND, 85, 86, 87, 88, 89, 90, 91, 92, 93 GND, 94 GND, 95, 96, 97, 98, 99, 100, 101, 102, 103 GND, 104 GND
part C pins: 105 GND, 106 GND, 107, 108, 109, 110, 111, 112, 113, 114, 115 GND, 116 GND, 117, 118, 119, 120, 121, 122, 123, 124, 125 GND, 126 GND, 127, 128, 129, 130, 131, 132, 133, 134, 135 GND, 136 GND, 137, 138, 139, 140, 141, 142, 143, 144, 145 GND, 146 GND, 147, 148, 149, 150, 151, 152, 153, 154, 155 GND, 156 GND
part D pins: PC01, PC02, PC03, PC04, PC05, PC06, PC07, PC08
part A text: BANK 1
part B text: BANK 2
part C text: BANK 3
part D text: BANK 4

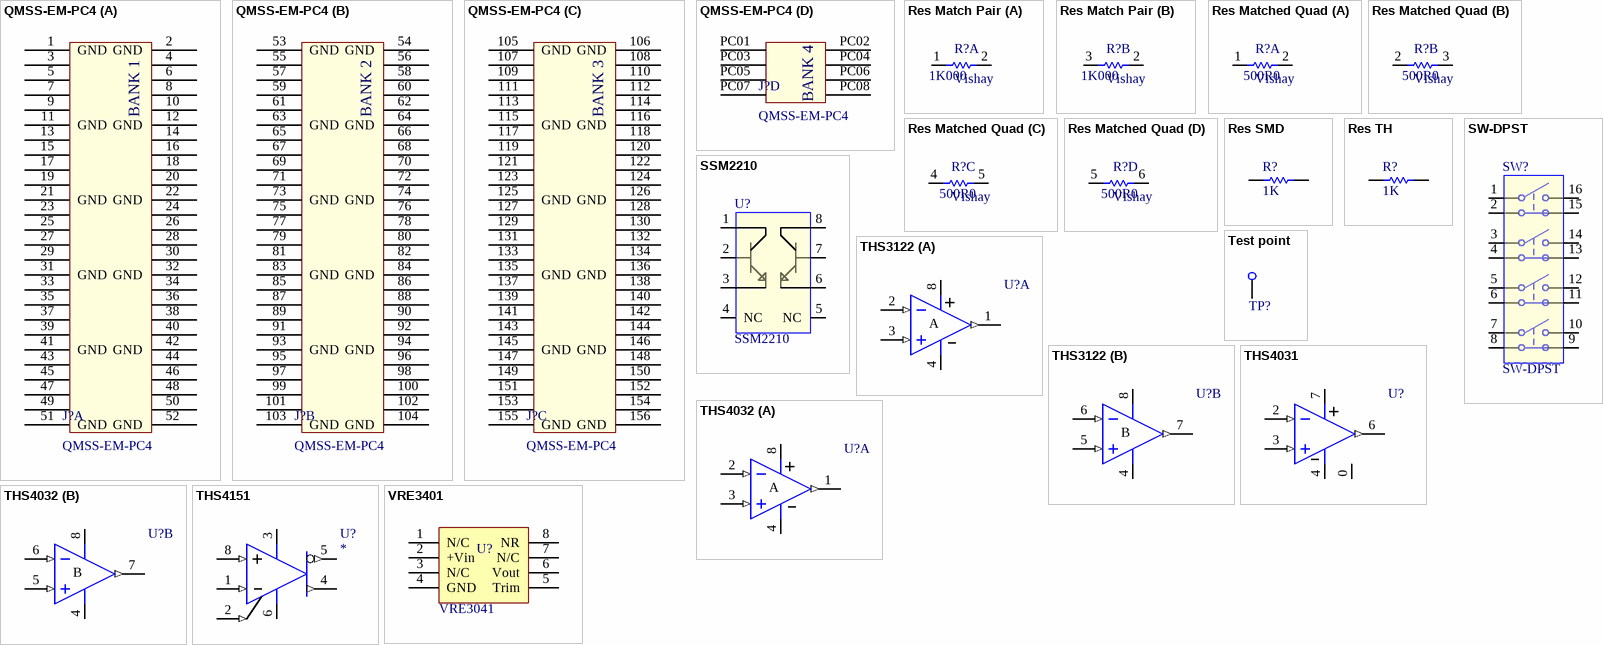
[diagram p2: symbols QMSS-EM-PC4 to VRE3401]

## QMSS-EM-PC4
designator J?
SAMTEC QMSS W/PWR PINS
footprint QMS EDGE PWR PINS (78 pos (156 pin) + 8 pwr pins)
part A pins: 1 GND, 2 GND, 3, 4, 5, 6, 7, 8, 9, 10, 11 GND, 12 GND, 13, 14, 15, 16, 17, 18, 19, 20, 21 GND, 22 GND, 23, 24, 25, 26, 27, 28, 29, 30, 31 GND, 32 GND, 33, 34, 35, 36, 37, 38, 39, 40, 41 GND, 42 GND, 43, 44, 45, 46, 47, 48, 49, 50, 51 GND, 52 GND
part B pins: 53 GND, 54 GND, 55, 56, 57, 58, 59, 60, 61, 62, 63 GND, 64 GND, 65, 66, 67, 68, 69, 70, 71, 72, 73 GND, 74 GND, 75, 76, 77, 78, 79, 80, 81, 82, 83 GND, 84 GND, 85, 86, 87, 88, 89, 90, 91, 92, 93 GND, 94 GND, 95, 96, 97, 98, 99, 100, 101, 102, 103 GND, 104 GND
part C pins: 105 GND, 106 GND, 107, 108, 109, 110, 111, 112, 113, 114, 115 GND, 116 GND, 117, 118, 119, 120, 121, 122, 123, 124, 125 GND, 126 GND, 127, 128, 129, 130, 131, 132, 133, 134, 135 GND, 136 GND, 137, 138, 139, 140, 141, 142, 143, 144, 145 GND, 146 GND, 147, 148, 149, 150, 151, 152, 153, 154, 155 GND, 156 GND
part D pins: PC01, PC02, PC03, PC04, PC05, PC06, PC07, PC08
part A text: BANK 1
part B text: BANK 2
part C text: BANK 3
part D text: BANK 4

## Res Match Pair
designator R?, comment Vishay  value 1K000
TCR matched
footprint Vishay 3 pin (Matched pair)
part A pins: 1, 2
part B pins: 2, 3

## Res Matched Quad
designator R?, comment Vishay  value 500R0
TCR matched
footprint VISHAY 6 pin
part A pins: 1, 2
part B pins: 2, 3
part C pins: 4, 5
part D pins: 5, 6

## Res SMD
designator R?  value 1K
Resistor; Published: 8-Jun-2000; LatestRevisionDate: 17-Jul-2002; LatestRevisionNote: Re-released for DXP Platform.; PackageReference: AXIAL-0.3; Publisher: Altium Limited
footprint SMD_0805
pins: 1, 2

## Res TH
designator R?  value 1K
Resistor; Published: 8-Jun-2000; LatestRevisionDate: 17-Jul-2002; LatestRevisionNote: Re-released for DXP Platform.; PackageReference: AXIAL-0.3; Publisher: Altium Limited
footprint AXIAL-0.4 (Resistor; 2 Leads)
pins: 1, 2

## SSM2210
designator U?
Dual Matched NPN
footprint SO-8_M (8-Pin Small Outline Integrated Circuit 1.27 mm Pitch, IPC Low Density)
pins: 1 C1, 2 B1, 3 E1, 4 NC, 5 NC, 6 E2, 7 B2, 8 C2

## SW-DPST
designator SW?
SW-DIP 4-pos SPDT; Published: 24-Mar-1999; LatestRevisionDate: 17-Jul-2002; LatestRevisionNote: Re-released for DXP Platform.; PackageReference: DPST-4; Publisher: Altium Limited
footprint DIP-16 (DIP; 16 Leads; Row Spacing 7.62 mm; Pitch 2.54 mm)
pins: 1, 2 nc, 3 nc, 4 nc, 5 nc, 6 nc, 7 nc, 8 nc, 9, 10 nc, 11 nc, 12 nc, 13 nc, 14 nc, 15 nc, 16 nc

## Test point
designator TP?  (value not drawn)
Test Point
footprint PAD_80D_052H
pins: 1 TP "Test point"

## THS3122
designator U?
Video Buffer Current FB; Published: 4-Mar-2005; LatestRevisionDate: 13-Apr-2006; LatestRevisionNote: IPC-7351 Footprint Added.; DatasheetVersion: Rev. F 2004; PackageVersion: 2005; PackageReference: R-8; Publisher: Altium Limited; PackageDescription: 8-Pin Narrow Body Small Outline Integrated Circuit 1.27 mm Pitch; Code_JEDEC: MS-012-AA; Code_IPC: SOIC127P600-8; ComponentLink1Description: Manufacturer Link; ComponentLink1URL: http://www.analog.com/en/prod/0,,759_786_AD8052%2C00.html; ComponentLink2Description: Datasheet; ComponentLink2URL: http://www.analog.com/UploadedFiles/Data_Sheets/11673395AD8051_2_4_f.pdf
footprint R-8_N (8-Pin Narrow Body Small Outline Integrated Circuit 1.27 mm Pitch, IPC Medium Density)
footprint R-8_L (SOIC, 8-Leads, Body 4.9x3.9mm, Pitch 1.27mm, IPC High Density)
footprint R-8_M (SOIC, 8-Leads, Body 4.9x3.9mm, Pitch 1.27mm, IPC Low Density)
pins on every part: 4 V- (power), 8 V+ (power)
part A pins: 1 OUT (out), 2 IN- (in), 3 IN+ (in)
part B pins: 5 IN+ (in), 6 IN- (in), 7 OUT (out)
part A text: A
part B text: B

## THS4031
designator U?
Low Noise, High Speed Amplifier; Note: Pin 8 is not connected.; Published: 8-Jun-2000; LatestRevisionDate: 04-Mar-2005; LatestRevisionNote: Stylized 3D Model Added.; DatasheetVersion: 1992; PackageVersion: 1998; PackageReference: Q-8; Publisher: Altium Limited; PackageDescription: MSOP-8; ComponentLink1Description: Manufacturer Link; ComponentLink1URL: http://www.analog.com/en/prod/0,,759_786_AD745%2C00.html; ComponentLink2Description: Datasheet; ComponentLink2URL: http://www.analog.com/UploadedFiles/Data_Sheets/14077819AD745_d.pdf
footprint MSOP with PowerPAD (Shrink Small Outline, MSOP; 8 Leads; Body Width 3 mm; Pitch 0.65 mm)
pins: 0 PowerPAD, 1 LOGIC REF hidden, 2 IN- (in), 3 IN+ (in), 4 V- (power), 6 OUT (out), 7 V+ (power), 8 /DISABLE hidden

## THS4032
designator U?
Low noise fast BJT input; Published: 4-Mar-2005; LatestRevisionDate: 13-Apr-2006; LatestRevisionNote: IPC-7351 Footprint Added.; DatasheetVersion: Rev. F 2004; PackageVersion: 2005; PackageReference: R-8; Publisher: Altium Limited; PackageDescription: 8-Pin Narrow Body Small Outline Integrated Circuit 1.27 mm Pitch; Code_JEDEC: MS-012-AA; Code_IPC: SOIC127P600-8; ComponentLink1Description: Manufacturer Link; ComponentLink1URL: http://www.analog.com/en/prod/0,,759_786_AD8052%2C00.html; ComponentLink2Description: Datasheet; ComponentLink2URL: http://www.analog.com/UploadedFiles/Data_Sheets/11673395AD8051_2_4_f.pdf
footprint R-8_N (8-Pin Narrow Body Small Outline Integrated Circuit 1.27 mm Pitch, IPC Medium Density)
footprint R-8_L (SOIC, 8-Leads, Body 4.9x3.9mm, Pitch 1.27mm, IPC High Density)
footprint R-8_M (SOIC, 8-Leads, Body 4.9x3.9mm, Pitch 1.27mm, IPC Low Density)
pins on every part: 4 V- (power), 8 V+ (power)
part A pins: 1 OUT (out), 2 IN- (in), 3 IN+ (in)
part B pins: 5 IN+ (in), 6 IN- (in), 7 OUT (out)
part A text: A
part B text: B

## THS4151
designator U?
DIFF AMP
footprint 182h_m (8-Pin Small Outline Integrated Circuit 1.27 mm Pitch, IPC Low Density)
pins: 1 -IN (in), 2 VOCM (in), 3 V+, 4 +OUT (out), 5 -OUT (out), 6 V-, 7 NC hidden, 8 +IN (in)

## VRE3401
designator U?  value VRE3041  (hidden comment: VRE3401)
VREF 4.096V
footprint THALER 8-PIN SOP (SOJ, 8-Leads, Body 10.3x11.1mm (max), Pitch 2.54mm, IPC Low Density)
pins: 1 N/C, 2 +Vin, 3 N/C, 4 GND, 5 Trim, 6 Vout, 7 N/C, 8 NR